# Altium footprint library 7-Connectors-11.PcbLib: 59 footprints (part 4 of 4)
Each footprint in its own frame and in the unit in brackets; x right, y up, seen from the top. Pads: shape width x height; smd on the part's side, far side on the other; paste and mask are expansions set on the pad; w line width, h text height; cw(c..) or ccw(c..) is an arc to the next point about the centre after c.
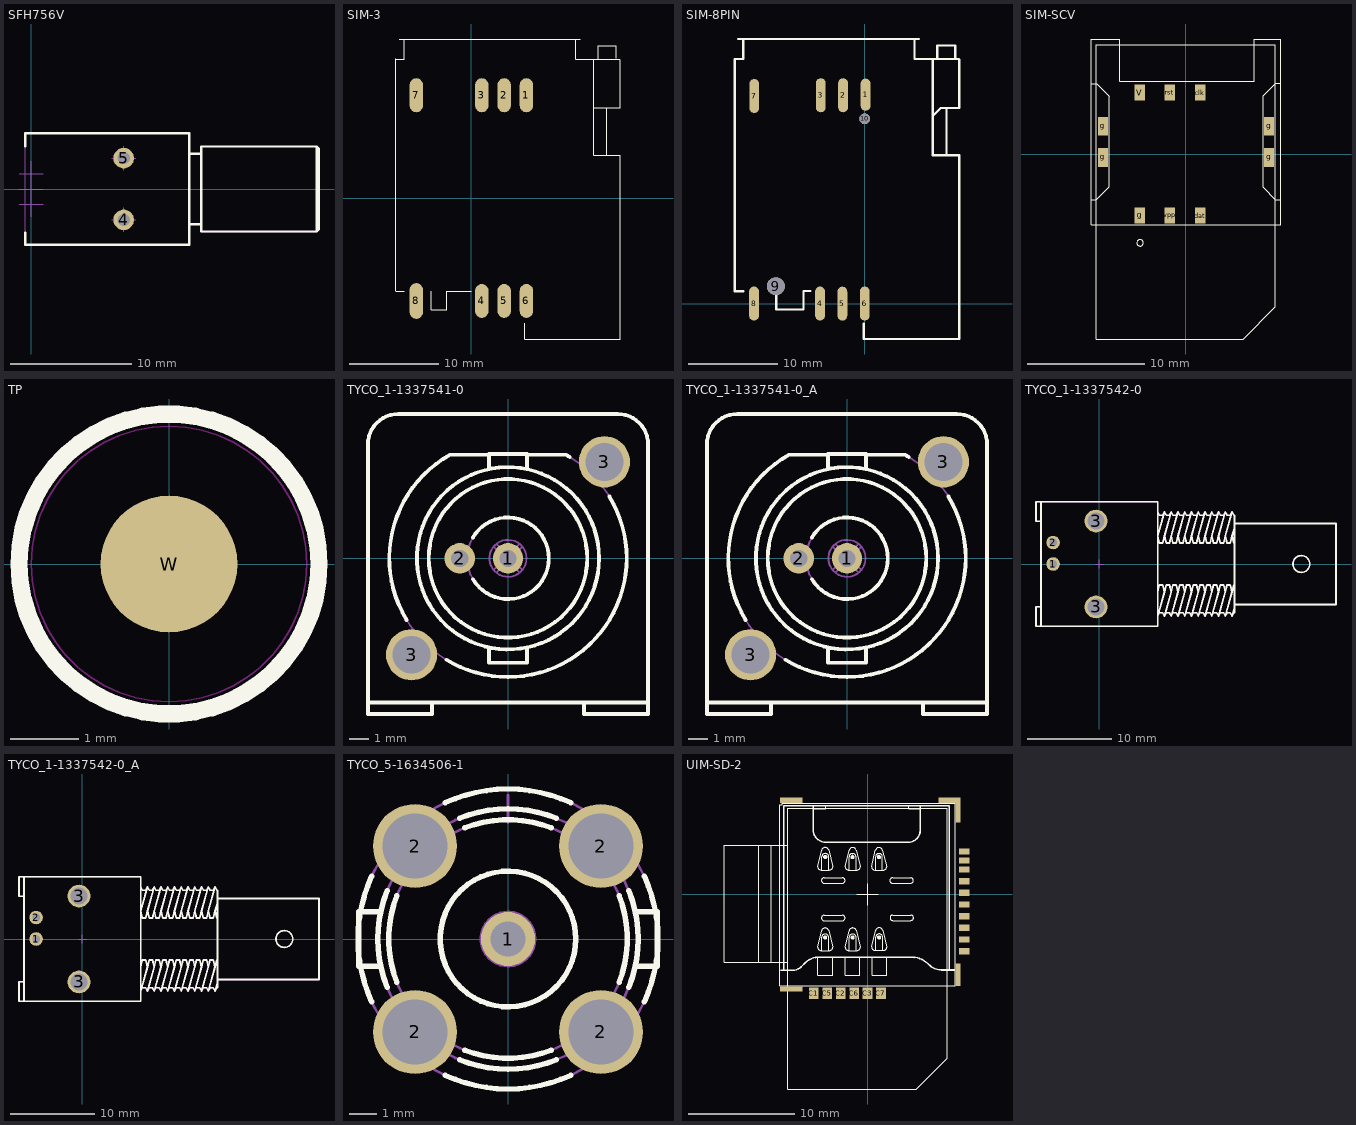
[diagram p3: the footprints below, top view; thin cyan lines are the x and y axes]

## SFH756V [mm] "Plastic Connector Housing For Plastic Fiber Optic Photodiode Detector"
height 9
pads (2):
  round 1.7 hole 1: 4(7.62,-2.54) 5(7.62,2.54)
Top Overlay:
  lines w0.2: -0.5,-3.617 -0.5,-4.6 13,-4.6 13,4.6 -0.5,4.6 -0.5,3.534 ; 13,-2.9 14,-2.9 ; 13,2.9 14,2.9 ; 23.5,-3.5 23.7,-3.3 23.7,3.3 23.5,3.5 ; 23.5,-3.5 23.5,3.5 ; 23.5,-3.5 14,-3.5 14,3.5 23.5,3.5
Mechanical 8:
  lines w0.1: -1,-1.27 0,-1.27 ; -1,0 0,0 ; -1,1.27 0,1.27 ; 0,-2.27 0,-1.27 ; 0,-1 0,0 ; 0,-0.27 0,-1.27 ; 0,0.27 0,1.27 ; 0,1 0,0 ; 0,2.27 0,1.27 ; 1,-1.27 0,-1.27 ; 1,0 0,0 ; 1,1.27 0,1.27 ; 6.62,-2.54 7.62,-2.54 ; 6.62,2.54 7.62,2.54 ; 7.62,-3.54 7.62,-2.54 ; 7.62,-1.54 7.62,-2.54 ; 7.62,1.54 7.62,2.54 ; 7.62,3.54 7.62,2.54 ; 8.62,-2.54 7.62,-2.54 ; 8.62,2.54 7.62,2.54
Mechanical 14:
  lines w0.1: 13,-2.9 14,-2.9 ; 13,2.9 14,2.9 ; 23.5,-3.5 23.7,-3.3 23.7,3.3 23.5,3.5 ; 23.5,-3.5 23.5,3.5 ; 23.5,-3.5 14,-3.5 14,3.5 23.5,3.5 ; -0.5,-4.6 -0.5,4.6 13,4.6 13,-4.6 -0.5,-4.6
3D body "SFH756V.stp": height 8.6, standoff -3.6, extent -0.5,-4.6 23.7,4.6

## SIM-3 [mm]
height 9
pads (8):
  oval 1.5x3.81 smd mask+0.051: 1(6.165,11.519) 2(3.665,11.519) 3(1.165,11.519) 4(1.165,-11.519) 5(3.665,-11.519) 6(6.165,-11.519) 7(-6.165,11.52)
  oval 1.5x4 smd mask+0.051: 8(-6.165,-11.52)
Top Overlay:
  lines w0.076: -8.465,-10.427 -8.465,15.583 ; -8.465,15.579 -7.511,15.579 -7.511,17.819 ; -8.393,-10.427 -7.524,-10.427 ; -8.095,17.819 12.174,17.819 ; -4.515,-10.414 -4.515,-12.481 -2.735,-12.481 -2.735,-10.414 -0.018,-10.414 ; 5.976,-14.033 5.976,-15.781 16.665,-15.781 16.665,4.813 15.175,4.813 ; 11.666,17.819 11.666,15.579 13.698,15.579 16.619,15.579 ; 13.698,15.558 13.698,4.813 15.175,4.813 ; 13.705,10.097 15.405,10.097 ; 14.206,15.579 14.206,17.082 16.238,17.082 16.238,15.685 ; 16.665,15.481 16.665,10.097 15.175,10.097 15.175,4.813
3D body "912283001.stp": height 3, standoff -0.1, extent -8.461,-15.131 16.539,17.069

## SIM-8PIN [mm]
height 9
pads (10):
  oval 1.1x3.6 smd: 1(0.093,23.398)
  oval 1.1x3.81 smd: 2(-2.421,23.334) 3(-4.921,23.334) 4(-5,0) 5(-2.507,-0.002) 6(0,0) 7(-12.378,23.246) 8(-12.4,0)
  round 2 hole 2: 9(-9.957,1.948)
  round 1.2 hole 1.2: 10(-0.007,20.698)
Top Overlay:
  lines w0.254: -14.551,1.388 -14.551,27.398 ; -14.551,27.394 -13.597,27.394 -13.597,29.634 ; -14.479,1.388 -13.61,1.388 ; -14.181,29.634 6.088,29.634 ; -10.676,1.401 -9.914,1.401 -9.914,-0.568 ; -9.914,-0.666 -6.866,-0.666 ; -6.866,-0.568 -6.866,1.401 -6.104,1.401 ; -0.11,-2.219 -0.11,-3.966 10.579,-3.966 10.579,16.628 7.612,16.628 7.612,27.372 ; 5.58,29.634 5.58,27.394 7.612,27.394 10.533,27.394 ; 7.612,21.022 8.501,21.911 10.579,21.911 10.579,27.296 ; 8.12,27.394 8.12,28.896 10.152,28.896 10.152,27.499 ; 9.148,16.628 9.148,21.911
3D body "912283001.stp": height 3, standoff -0.1, extent -14.583,-3.549 10.417,28.651

## SIM-SCV [mm]
height 9
pads (10):
  rect 0.9x1.35 smd mask+0.051: clk(1.205,5.25) dat(1.205,-5.25) g(-3.945,-5.25) rst(-1.37,5.25) V(-3.945,5.25) vpp(-1.37,-5.25)
  rect 0.85x1.6 smd mask+0.051: g(-7.1,-0.29) g(-7.1,2.37) g(7.1,-0.29) g(7.1,2.37)
Top Overlay:
  circle w0.02: c-3.92,-7.583 r0.28
  lines w0.02: -8.1,-3.887 -7.668,-3.887 -6.576,-2.794 -6.576,4.953 -7.643,6.019 -8.1,6.019 ; 8.1,-3.887 7.615,-3.887 6.581,-2.853 6.581,4.978 7.648,6.045 8.1,6.045 ; -8.1,-6.05 -8.1,9.83 -5.65,9.83 -5.65,6.223 5.84,6.223 5.84,9.83 8.1,9.83 8.1,-6.05 -8.1,-6.05
  lines w0.025: -7.65,-15.799 -7.65,9.347 7.64,9.347 7.64,-13.039 4.88,-15.799 -7.65,-15.799
3D body "pt-simj.stp": height 1.8, standoff -0.05, extent -8.153,-6.68 8.267,6.92

## TP [mm]
height 11.7
pads (1):
  round 2 smd mask+1: W(0,0)
Top Overlay:
  circle w0.254: c0,0 r2.195
Keep-Out Layer:
  circle w0.025: c0,0 r2.017
3D body "1_016-1_016-3_tp.stp": height 0.02, standoff 0, extent -1.5,-1.5 1.5,1.5

## TYCO_1-1337541-0 [mm] "50 Ohms  BNC Elbow PCB Socket With Mounting Posts"
height 35.5
pads (4):
  round 1.6 hole 0.9: 1(0,0) 2(-2.54,0)
  round 2.7 hole 2: 3(-5.08,-5.08) 3(5.08,5.08)
Top Overlay:
  circle w0.2: c0,0 r4.175
  circle w0.2: c0,0 r4.8
  lines w0.2: -7.38,-7.6 7.38,-7.6 ; -5.34,-3.248 cw(c0,0) -3.06,5.45 -1,5.45 ; -4,-7.6 -4,-8.2 -7.38,-8.2 -7.38,6 cw(c-5.78,6) -5.78,7.6 5.78,7.6 cw(c5.78,6) 7.38,6 7.38,-8.2 4,-8.2 4,-7.6 ; -3.248,-5.34 ccw(c0,0) 5.34,3.248 ; -1.847,-1.1 ccw(c0,0) -1.847,1.1 ; -1,-4.695 -1,-5.5 1,-5.5 1,-4.695 ; -1,4.695 -1,5.5 1,5.5 1,4.695 ; 1,5.45 3.06,5.45 cw(c0,0) 3.248,5.34
Mechanical 8:
  lines w0.1: -5.58,-5.08 -5.08,-5.08 ; -5.08,-5.58 -5.08,-5.08 ; -5.08,-4.58 -5.08,-5.08 ; -4.58,-5.08 -5.08,-5.08 ; -3.04,0 -2.54,0 ; -2.54,-0.5 -2.54,0 ; -2.54,0.5 -2.54,0 ; -2.04,0 -2.54,0 ; -0.5,0 0,0 ; 0,-0.5 0,0 ; 0,0.5 0,0 ; 0.5,0 0,0 ; 4.58,5.08 5.08,5.08 ; 5.08,4.58 5.08,5.08 ; 5.08,5.58 5.08,5.08 ; 5.58,5.08 5.08,5.08
Mechanical 14:
  circle w0.1: c0,0 r0.975
  circle w0.1: c0,0 r0.625
  circle w0.1: c0,0 r2.15
  circle w0.1: c0,0 r4.175
  circle w0.1: c0,0 r4.8
  lines w0.1: -7.38,-7.6 7.38,-7.6 ; -4,-7.6 -4,-8.2 -7.38,-8.2 -7.38,6 cw(c-5.78,6) -5.78,7.6 5.78,7.6 cw(c5.78,6) 7.38,6 7.38,-8.2 4,-8.2 4,-7.6 ; -1,-4.695 -1,-5.5 1,-5.5 1,-4.695 ; -1,4.695 -1,5.5 1,5.5 1,4.695 ; -1,5.45 -3.06,5.45 ccw(c0,0) 3.06,5.45 1,5.45 ; -0.757,-0.615 -0.507,-0.366 ; -0.757,0.615 -0.507,0.366 ; -0.615,-0.757 -0.366,-0.507 ; -0.615,0.757 -0.366,0.507 ; 0.366,-0.507 0.615,-0.757 ; 0.366,0.507 0.615,0.757 ; 0.507,-0.366 0.757,-0.615 ; 0.507,0.366 0.757,0.615
3D body "TYCO_1-1337541-0.stp": height 35.5, standoff -4.25, extent -7.38,-8.2 7.38,7.6

## TYCO_1-1337541-0_A [mm] "50 Ohms  BNC Elbow PCB Socket With Mounting Posts"
height 35.5
pads (4):
  round 1.6 hole 0.9: 1(0,0) 2(-2.54,0)
  round 2.7 hole 2: 3(-5.08,-5.08) 3(5.08,5.08)
Top Overlay:
  circle w0.2: c0,0 r4.175
  circle w0.2: c0,0 r4.8
  lines w0.2: -7.38,-7.6 7.38,-7.6 ; -5.34,-3.248 cw(c0,0) -3.06,5.45 -1,5.45 ; -4,-7.6 -4,-8.2 -7.38,-8.2 -7.38,6 cw(c-5.78,6) -5.78,7.6 5.78,7.6 cw(c5.78,6) 7.38,6 7.38,-8.2 4,-8.2 4,-7.6 ; -3.248,-5.34 ccw(c0,0) 5.34,3.248 ; -1.847,-1.1 ccw(c0,0) -1.847,1.1 ; -1,-4.695 -1,-5.5 1,-5.5 1,-4.695 ; -1,4.695 -1,5.5 1,5.5 1,4.695 ; 1,5.45 3.06,5.45 cw(c0,0) 3.248,5.34
Mechanical 8:
  lines w0.1: -5.58,-5.08 -5.08,-5.08 ; -5.08,-5.58 -5.08,-5.08 ; -5.08,-4.58 -5.08,-5.08 ; -4.58,-5.08 -5.08,-5.08 ; -3.04,0 -2.54,0 ; -2.54,-0.5 -2.54,0 ; -2.54,0.5 -2.54,0 ; -2.04,0 -2.54,0 ; -0.5,0 0,0 ; 0,-0.5 0,0 ; 0,0.5 0,0 ; 0.5,0 0,0 ; 4.58,5.08 5.08,5.08 ; 5.08,4.58 5.08,5.08 ; 5.08,5.58 5.08,5.08 ; 5.58,5.08 5.08,5.08
Mechanical 14:
  circle w0.1: c0,0 r0.975
  circle w0.1: c0,0 r0.625
  circle w0.1: c0,0 r2.15
  circle w0.1: c0,0 r4.175
  circle w0.1: c0,0 r4.8
  lines w0.1: -7.38,-7.6 7.38,-7.6 ; -4,-7.6 -4,-8.2 -7.38,-8.2 -7.38,6 cw(c-5.78,6) -5.78,7.6 5.78,7.6 cw(c5.78,6) 7.38,6 7.38,-8.2 4,-8.2 4,-7.6 ; -1,-4.695 -1,-5.5 1,-5.5 1,-4.695 ; -1,4.695 -1,5.5 1,5.5 1,4.695 ; -1,5.45 -3.06,5.45 ccw(c0,0) 3.06,5.45 1,5.45 ; -0.757,-0.615 -0.507,-0.366 ; -0.757,0.615 -0.507,0.366 ; -0.615,-0.757 -0.366,-0.507 ; -0.615,0.757 -0.366,0.507 ; 0.366,-0.507 0.615,-0.757 ; 0.366,0.507 0.615,0.757 ; 0.507,-0.366 0.757,-0.615 ; 0.507,0.366 0.757,0.615
3D body "TYCO_1-1634817-0_a.stp": height 15.07, standoff 14.3, extent -7.9,-7.9 7.9,7.9
3D body "TYCO_1-1634816-0_a.stp": height 17.6, standoff 15.1, extent -7,-8.083 7,8.083
3D body "TYCO_1-1337541-0.stp": height 35.5, standoff -4.25, extent -7.38,-8.2 7.38,7.6

## TYCO_1-1337542-0 [mm] "50 Ohms  BNC Elbow PCB Socket With Mounting Posts"
height 13.16
pads (4):
  round 1.6 hole 0.9: 1(-5.48,0) 2(-5.48,2.54)
  round 2.7 hole 2: 3(-0.4,-5.08) 3(-0.4,5.08)
Top Overlay:
  drawing of 177 lines, arcs and shapes, not listed
Mechanical 8:
  lines w0.1: -5.98,0 -5.48,0 ; -5.98,2.54 -5.48,2.54 ; -5.48,-0.5 -5.48,0 ; -5.48,0.5 -5.48,0 ; -5.48,2.04 -5.48,2.54 ; -5.48,3.04 -5.48,2.54 ; -4.98,0 -5.48,0 ; -4.98,2.54 -5.48,2.54 ; -0.9,-5.08 -0.4,-5.08 ; -0.9,5.08 -0.4,5.08 ; -0.5,0 0,0 ; -0.4,-5.58 -0.4,-5.08 ; -0.4,-4.58 -0.4,-5.08 ; -0.4,4.58 -0.4,5.08 ; -0.4,5.58 -0.4,5.08 ; 0,-0.5 0,0 ; 0,0.5 0,0 ; 0.1,-5.08 -0.4,-5.08 ; 0.1,5.08 -0.4,5.08 ; 0.5,0 0,0
Mechanical 14:
  drawing of 177 lines, arcs and shapes, not listed
3D body "TYCO_1-1337542-0.stp": height 13.16, standoff -4.3, extent -7.5,-7.35 28,7.35

## TYCO_1-1337542-0_A [mm] "50 Ohms  BNC Elbow PCB Socket With Mounting Posts"
height 13.16
pads (4):
  round 1.6 hole 0.9: 1(-5.48,0) 2(-5.48,2.54)
  round 2.7 hole 2: 3(-0.4,-5.08) 3(-0.4,5.08)
Top Overlay:
  drawing of 177 lines, arcs and shapes, not listed
Mechanical 8:
  lines w0.1: -5.98,0 -5.48,0 ; -5.98,2.54 -5.48,2.54 ; -5.48,-0.5 -5.48,0 ; -5.48,0.5 -5.48,0 ; -5.48,2.04 -5.48,2.54 ; -5.48,3.04 -5.48,2.54 ; -4.98,0 -5.48,0 ; -4.98,2.54 -5.48,2.54 ; -0.9,-5.08 -0.4,-5.08 ; -0.9,5.08 -0.4,5.08 ; -0.5,0 0,0 ; -0.4,-5.58 -0.4,-5.08 ; -0.4,-4.58 -0.4,-5.08 ; -0.4,4.58 -0.4,5.08 ; -0.4,5.58 -0.4,5.08 ; 0,-0.5 0,0 ; 0,0.5 0,0 ; 0.1,-5.08 -0.4,-5.08 ; 0.1,5.08 -0.4,5.08 ; 0.5,0 0,0
Mechanical 14:
  drawing of 177 lines, arcs and shapes, not listed
3D body "TYCO_1-1634416-0.stp": height 13.85, standoff -0.15, extent 7.67,-8.083 10.17,8.083
3D body "TYCO_1-1634817-0.stp": height 14.79, standoff -1.01, extent 6.9,-7.917 7.67,7.883
3D body "TYCO_1-1337542-0.stp": height 13.16, standoff -4.3, extent -7.5,-7.35 28,7.35

## TYCO_5-1634506-1 [mm] "50 Ohm BNC PCB Receptacle (Jack), Post Terminal, 4 Legs"
height 16.7
pads (5):
  round 2 hole 1.3: 1(0,0)
  round 3.1 hole 2.4: 2(-3.43,-3.43) 2(-3.43,3.43) 2(3.43,-3.43) 2(3.43,3.43)
Top Overlay:
  circle w0.2: c0,0 r2.5
  lines w0.2: -5.027,-2.311 cw(c0,0) -5.027,2.311 ; -4.695,-1 -5.5,-1 -5.5,1 -4.695,1 ; -4.46,-1.774 cw(c0,0) -4.46,1.774 ; -4.099,-1.598 cw(c0,0) -4.099,1.598 ; -2.311,-5.027 ccw(c0,0) 2.311,-5.027 ; -2.311,5.027 cw(c0,0) 2.311,5.027 ; -1.774,-4.46 ccw(c0,0) 1.774,-4.46 ; -1.774,4.46 cw(c0,0) 1.774,4.46 ; -1.598,-4.099 ccw(c0,0) 1.598,-4.099 ; -1.598,4.099 cw(c0,0) 1.598,4.099 ; 4.099,-1.598 ccw(c0,0) 4.099,1.598 ; 4.46,-1.774 ccw(c0,0) 4.46,1.774 ; 4.695,-1 5.5,-1 5.5,1 4.695,1 ; 5.027,-2.311 ccw(c0,0) 5.027,2.311
Mechanical 8:
  lines w0.1: -4.43,-3.43 -3.43,-3.43 ; -4.43,3.43 -3.43,3.43 ; -3.43,-4.43 -3.43,-3.43 ; -3.43,-2.43 -3.43,-3.43 ; -3.43,2.43 -3.43,3.43 ; -3.43,4.43 -3.43,3.43 ; -2.43,-3.43 -3.43,-3.43 ; -2.43,3.43 -3.43,3.43 ; -1,0 0,0 ; 0,-1 0,0 ; 0,1 0,0 ; 0,4.3 0,5.3 ; 1,0 0,0 ; 2.43,-3.43 3.43,-3.43 ; 2.43,3.43 3.43,3.43 ; 3.43,-4.43 3.43,-3.43 ; 3.43,-2.43 3.43,-3.43 ; 3.43,2.43 3.43,3.43 ; 3.43,4.43 3.43,3.43 ; 4.43,-3.43 3.43,-3.43 ; 4.43,3.43 3.43,3.43
Mechanical 14:
  circle w0.1: c0,0 r5.533
  circle w0.1: c0,0 r4.4
  circle w0.1: c0,0 r4.8
  circle w0.1: c0,0 r2.5
  circle w0.1: c0,0 r1
  circle w0.1: c0,0 r0.4
  lines w0.1: -4.695,-1 -5.5,-1 -5.5,1 -4.695,1 ; 4.695,-1 5.5,-1 5.5,1 4.695,1
3D body "TYCO_5-1634506-1.stp": height 16.7, standoff -3.18, extent -5.5,-5.5 5.5,5.5

## UIM-SD-2 [mm] "KZ-F5-END-049-A"
height 8.58
pads (21):
  rect 1x0.6 smd mask+0.051: 1(9.13,2.35) 2(9.13,1.25) 3(9.13,0.15) 4(9.13,-0.95) 5(9.13,-2.05) 6(9.13,-3.15) 7(9.13,-4.25) 8(9.13,-5.35) A(9.13,4.05) B(9.13,3.2)
  rect 0.9x1.1 smd mask+0.051: C1(-5.08,-9.299) C2(-2.54,-9.299) C3(0,-9.299) C5(-3.81,-9.299) C6(-1.27,-9.299) C7(1.27,-9.299)
  rect 2.13x0.5 smd mask+0.051: g(-7.188,-8.915)
  rect 2.1x0.5 smd mask+0.051: g(-7.188,8.89) g(7.729,8.89)
  rect 0.5x2.2 smd mask+0.051: g(8.534,7.899)
  rect 0.5x2.13 smd mask+0.051: g(8.534,-7.569)
Top Overlay:
  circle w0.254: c1.095,-4.048 r0.071
  circle w0.254: c-1.405,-4.057 r0.071
  circle w0.254: c-3.995,-4.057 r0.071
  circle w0.254: c-3.985,3.533 r0.071
  circle w0.254: c-1.415,3.523 r0.071
  circle w0.254: c1.075,3.523 r0.071
  lines w0.013: -10.25,-6.365 -10.25,4.635 ; -9.05,-6.365 -9.05,4.635 ; -7.5,-6.375 -13.5,-6.375 -13.5,4.635 -7.5,4.635 ; -1,0 1,0 ; 0,-1 0,1 ; -7.5,-18.335 4.59,-18.335 7.5,-15.425 7.5,8.14 -7.5,8.14 -7.5,-18.335
  lines w0.025: -8.02,8.585 -8.02,8.479 -8.25,8.479 -8.25,-8.6 8.25,-8.6 8.25,8.6 -8.02,8.6 ; -5.05,8.073 -3.958,8.073 -3.958,8.37 ; -4.669,-5.948 -4.669,-7.599 -3.272,-7.599 -3.272,-5.923 ; -4.312,-5.288 -4.312,-4.038 cw(c-4.001,-4.038) -4.001,-3.727 -3.982,-3.727 cw(c-3.982,-4.046) -3.663,-4.046 -3.663,-5.288 ; -4.302,2.302 -4.302,3.552 cw(c-3.991,3.552) -3.991,3.863 -3.972,3.863 cw(c-3.972,3.544) -3.653,3.544 ; -3.653,2.302 -3.653,3.544 ; -2.103,-5.948 -2.103,-7.599 -0.732,-7.599 -0.732,-5.923 ; -1.732,2.292 -1.732,3.542 cw(c-1.421,3.542) -1.421,3.853 -1.402,3.853 cw(c-1.402,3.534) -1.083,3.534 -1.083,2.292 ; -1.722,-5.288 -1.722,-4.038 cw(c-1.411,-4.038) -1.411,-3.727 -1.392,-3.727 cw(c-1.392,-4.046) -1.073,-4.046 -1.073,-5.288 ; 0.462,-5.948 0.462,-7.599 1.808,-7.599 1.808,-5.923 ; 0.758,2.292 0.758,3.542 cw(c1.069,3.542) 1.069,3.853 1.088,3.853 cw(c1.088,3.534) 1.407,3.534 1.407,2.292 ; 0.778,-5.278 0.778,-4.028 cw(c1.089,-4.028) 1.089,-3.718 1.108,-3.718 cw(c1.108,-4.037) 1.427,-4.037 ; 1.427,-5.278 1.427,-4.037 ; 3.866,8.37 3.866,8.073 4.932,8.073
  lines w0.051: -4.379,2.302 -3.61,2.302 ; -4.367,2.302 cw(c-4.367,2.633) -4.697,2.633 -4.332,4.19 cw(c-3.999,4.083) -3.669,4.199 -3.275,2.625 cw(c-3.598,2.625) -3.598,2.302 ; -4.08,-2.477 cw(c-4.08,-2.217) -4.08,-1.957 -2.38,-1.957 cw(c-2.38,-2.217) -2.38,-2.478 -4.07,-2.478 ; -4.08,1.063 cw(c-4.08,1.323) -4.08,1.583 -2.38,1.583 cw(c-2.38,1.323) -2.38,1.062 ; -4.07,1.062 -2.38,1.062 ; 2.36,1.053 cw(c2.36,1.313) 2.36,1.573 4.06,1.573 cw(c4.06,1.313) 4.06,1.052 2.37,1.052 ; 2.38,-2.457 cw(c2.38,-2.197) 2.38,-1.937 4.08,-1.937 cw(c4.08,-2.197) 4.08,-2.458 2.39,-2.458 ; -4.697,-4.957 ccw(c-4.367,-4.957) -4.367,-5.288 -3.598,-5.288 ccw(c-3.598,-4.965) -3.275,-4.965 -3.669,-3.391 ccw(c-3.999,-3.507) -4.332,-3.4 -4.697,-4.957 ; -2.107,2.623 ccw(c-1.777,2.623) -1.777,2.292 -1.008,2.292 ccw(c-1.008,2.615) -0.685,2.615 -1.079,4.189 ccw(c-1.409,4.073) -1.742,4.18 -2.107,2.623 ; -2.103,-4.957 ccw(c-1.773,-4.957) -1.773,-5.288 -1.004,-5.288 ccw(c-1.004,-4.965) -0.681,-4.965 -1.075,-3.391 ccw(c-1.405,-3.507) -1.738,-3.4 -2.103,-4.957 ; 0.383,2.623 ccw(c0.713,2.623) 0.713,2.292 1.482,2.292 ccw(c1.482,2.615) 1.805,2.615 1.411,4.189 ccw(c1.081,4.073) 0.748,4.18 0.383,2.623 ; 0.403,-4.947 ccw(c0.733,-4.947) 0.733,-5.278 1.502,-5.278 ccw(c1.502,-4.955) 1.825,-4.955 1.431,-3.381 ccw(c1.101,-3.497) 0.768,-3.39 0.403,-4.947
  lines w0.152: -8.19,-7.142 -7.031,-7.142 ccw(c-7.031,-6.05) -6.259,-6.822 ; -7.895,-7.142 -7.895,8.37 7.71,8.37 7.71,-7.117 6.939,-7.117 cw(c6.939,-5.593) 5.861,-6.67 ; -6.26,-6.838 -5.822,-6.395 ; -5.808,-6.384 cw(c-4.694,-7.498) -4.694,-5.923 4.24,-5.923 cw(c4.24,-7.978) 5.693,-6.525 5.85,-6.682 ; -5.126,8.36 -5.126,6.109 ccw(c-3.94,6.109) -3.94,4.923 3.866,4.923 ccw(c3.866,6.015) 4.958,6.015 4.958,8.36 ; 7.599,-7.117 8.18,-7.117
3D body "uim_sd2.stp": height 2.7, standoff 0, extent -8.792,-9.398 9.148,9.044